# Altium footprint library JL_PCB.PCBLIB: 1112 footprints (part 47 of 71)
Each footprint in its own frame and in the unit in brackets; x right, y up, seen from the top. Pads: shape width x height; smd on the part's side, far side on the other; paste and mask are expansions set on the pad; w line width, h text height; cw(c..) or ccw(c..) is an arc to the next point about the centre after c.
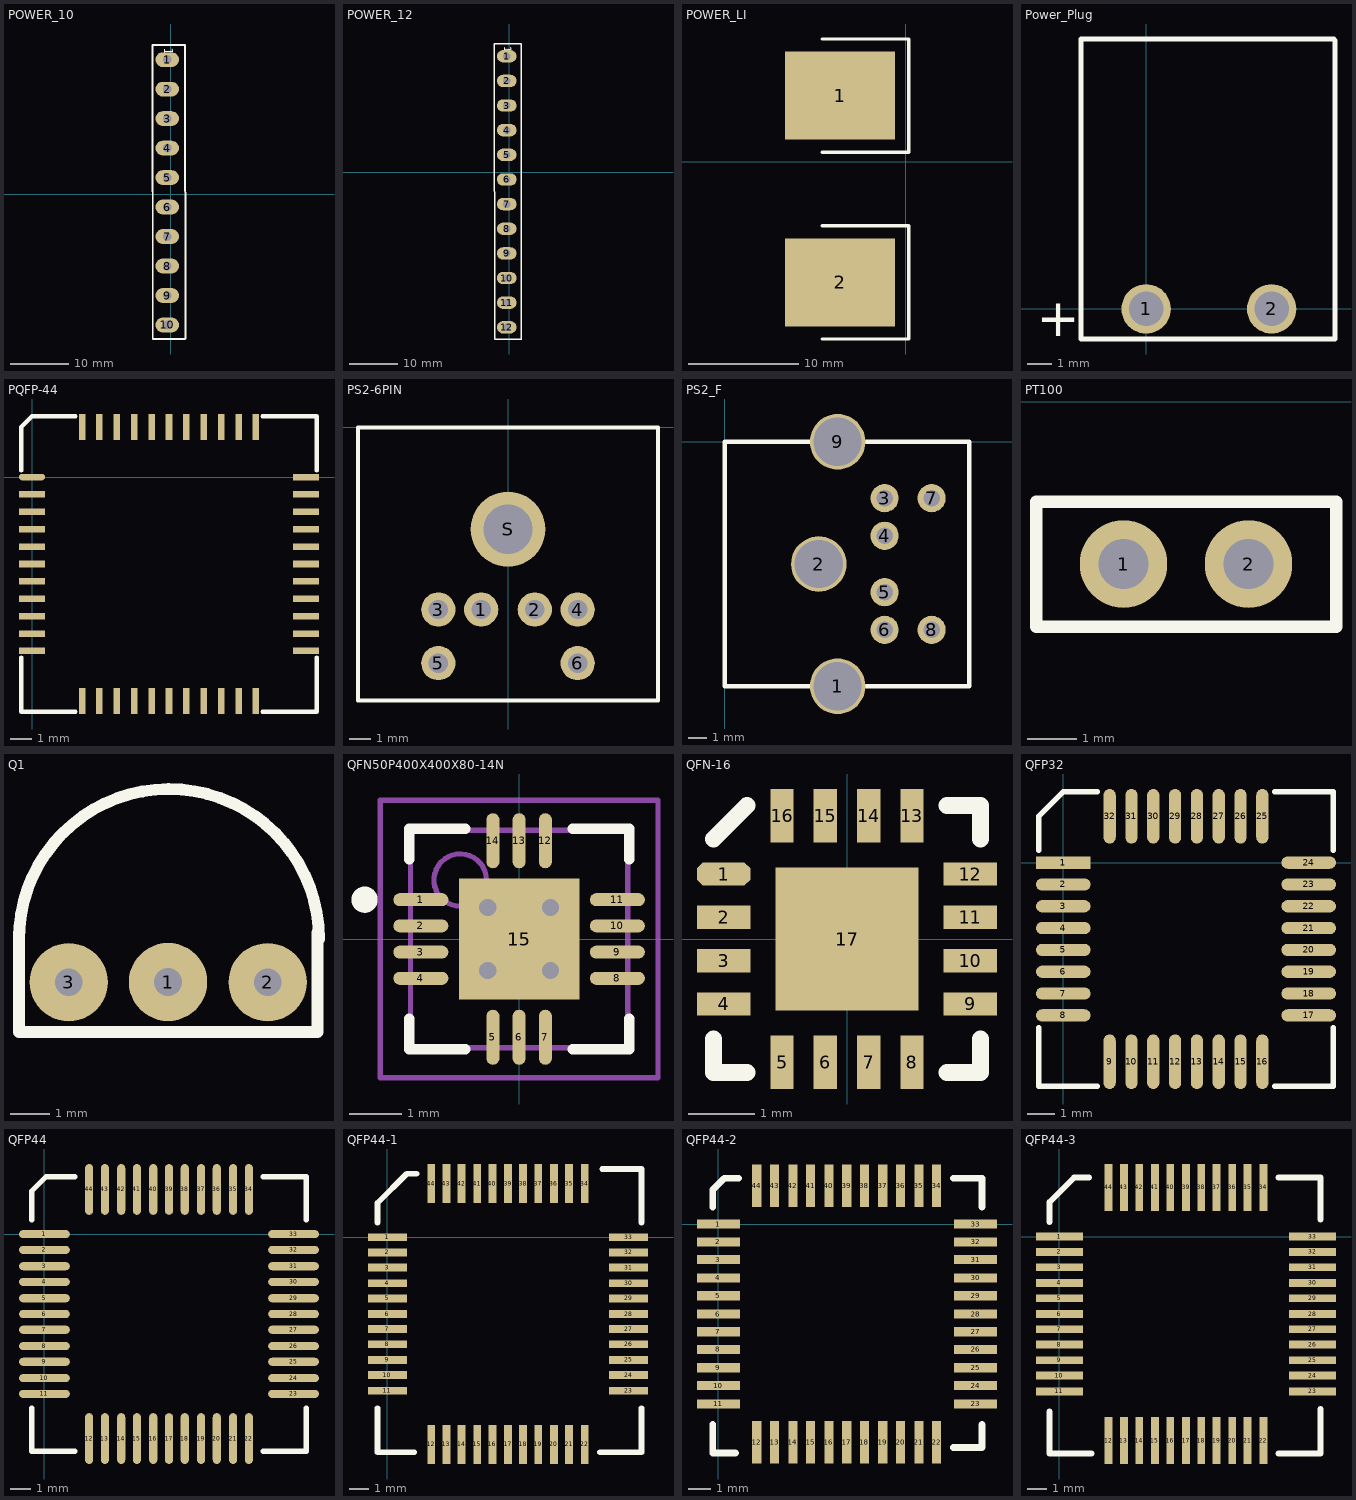
[diagram p46: the footprints below, top view; thin cyan lines are the x and y axes]

## POWER_10 [mil]
pads (10):
  oval 160x100 hole 60: 1(-24,913) 2(-24,713) 3(-24,513) 4(-24,313) 5(-24,113) 6(-24,-87) 7(-24,-287) 8(-24,-487) 9(-24,-687) 10(-24,-887)
TopOverlay:
  lines w12: 97,-982 -123,-982 -124,1013 96,1013 100,-980
  text "1" at -44,993 h60

## POWER_12 [mil]
pads (12):
  oval 160x100 hole 60: 1(-22,940) 2(-22,740) 3(-22,540) 4(-22,340) 5(-22,140) 6(-22,-60) 7(-22,-260) 8(-22,-460) 9(-22,-660) 10(-22,-860) 11(-22,-1060) 12(-22,-1260)
TopOverlay:
  lines w12: 98,-1355 98,1040 -122,1040 -121,-1355 99,-1355
  text "1" at -42,1020 h60

## POWER_LI [mm]
pads (2):
  rect 10x8 smd: 1(-6,6) 2(-6,-11)
TopOverlay:
  lines w0.305: -7.635,-16.159 0.27,-16.159 0.27,-5.841 -7.635,-5.841 ; -7.635,0.841 0.27,0.841 0.27,11.159 -7.635,11.159

## Power_Plug [mm]
pads (2):
  round 2 hole 1.4: 1(0,0) 2(5.08,0)
TopOverlay:
  lines w0.2: -2.642,10.871 -2.642,-1.219 7.595,-1.219 ; -2.642,10.922 7.595,10.922 ; 7.645,-1.219 7.645,10.871
  text "+" at -4.42,-1.118 h1.52

## PQFP-44 [mm]
pads (44):
  oval 1.2x0.3 smd: 1(0,0)
  rect 1.2x0.3 smd: 2(0,-0.8) 3(0,-1.6) 4(0,-2.4) 5(0,-3.2) 6(0,-4) 7(0,-4.8) 8(0,-5.6) 9(0,-6.4) 10(0,-7.2) 11(0,-8) 23(12.6,-8) 24(12.6,-7.2) 25(12.6,-6.4) 26(12.6,-5.6) 27(12.6,-4.8) 28(12.6,-4) 29(12.6,-3.2) 30(12.6,-2.4) 31(12.6,-1.6) 32(12.6,-0.8) 33(12.6,0)
  rect 0.3x1.2 smd: 12(2.3,-10.3) 13(3.1,-10.3) 14(3.9,-10.3) 15(4.7,-10.3) 16(5.5,-10.3) 17(6.3,-10.3) 18(7.1,-10.3) 19(7.9,-10.3) 20(8.7,-10.3) 21(9.5,-10.3) 22(10.3,-10.3) 34(10.3,2.3) 35(9.5,2.3) 36(8.7,2.3) 37(7.9,2.3) 38(7.1,2.3) 39(6.3,2.3) 40(5.5,2.3) 41(4.7,2.3) 42(3.9,2.3) 43(3.1,2.3) 44(2.3,2.3)
TopOverlay:
  lines w0.2: -0.5,-8.3 -0.5,-10.8 2,-10.8 ; -0.5,0.3 -0.5,2.3 0,2.8 2,2.8 ; 10.6,-10.8 13.1,-10.8 13.1,-8.3 ; 10.6,2.8 13.1,2.8 13.1,0.3

## PS2-6PIN [mm] "PS2 Socket, 6 Pin, Through Hole"
pads (7):
  round 1.6 hole 0.9: 1(-1.25,-8.5) 2(1.25,-8.5) 3(-3.25,-8.5) 4(3.25,-8.5) 5(-3.25,-11) 6(3.25,-11)
  round 3.5 hole 2.3: S(0,-4.75)
TopOverlay:
  lines w0.2: -7,-12.75 -7,0 7,0 7,-12.75 -7,-12.75

## PS2_F [mil]
pads (9):
  round 118.11 hole 102.36: 1(240,-520) 2(200,-260) 9(240,0)
  round 60 hole 35: 3(340,-120) 4(340,-200) 5(340,-320) 6(340,-400) 7(440,-120) 8(440,-400)
TopOverlay:
  lines w10: 0,-140 0,-120 ; 0,-520 520,-520 520,0 0,0 0,-520

## PT100 [mil]
pads (2):
  round 70 hole 40: 1(570,-130) 2(670,-130)
TopOverlay:
  lines w10: 500,-180 500,-80 740,-80 740,-180 500,-180

## Q1 [mm]
pads (3):
  round 2 hole 0.711: 1(34.736,-62.88) 2(37.28,-62.886) 3(32.2,-62.886)
TopOverlay:
  lines w0.3: 30.93,-61.81 cw(c34.76,-61.781) 38.59,-61.781
  lines w0.305: 30.93,-61.616 30.93,-64.156 38.55,-64.156 38.55,-61.616

## QFN50P400X400X80-14N [mm] "QFN, 14-Leads, Body 4.2x4.2mm (max), Pitch 0.50mm, IPC Medium Density"
height 3.55
pads (15):
  oval 1.05x0.25 smd: 1(-1.875,0.75) 2(-1.875,0.25) 3(-1.875,-0.25) 4(-1.875,-0.75) 8(1.875,-0.75) 9(1.875,-0.25) 10(1.875,0.25) 11(1.875,0.75)
  oval 0.25x1.05 smd: 5(-0.5,-1.875) 6(0,-1.875) 7(0.5,-1.875) 12(0.5,1.875) 13(0,1.875) 14(-0.5,1.875)
  rect 2.3x2.3 smd: 15(0,0)
via 0.6,-0.6 diameter 0.66 hole 0.33
via -0.6,-0.6 diameter 0.66 hole 0.33
via 0.6,0.6 diameter 0.66 hole 0.33
via -0.6,0.6 diameter 0.66 hole 0.33
TopOverlay:
  circle w0.25: c-2.95,0.75 r0.125
  lines w0.2: -2.1,-1.525 -2.1,-2.1 -1.025,-2.1 ; -2.1,1.525 -2.1,2.1 -1.025,2.1 ; 1.025,-2.1 2.1,-2.1 2.1,-1.525 ; 1.025,2.1 2.1,2.1 2.1,1.525
Mechanical13:
  circle w0.1: c-1.125,1.125 r0.5
  lines w0.1: -2.075,-2.075 2.075,-2.075 2.075,2.075 -2.075,2.075 -2.075,-2.075
Mechanical15:
  lines w0.1: -0.5,0 0.5,0 ; 0,-0.5 0,0.5 ; -2.65,-2.65 2.65,-2.65 2.65,2.65 -2.65,2.65 -2.65,-2.65
3D body: height 0.8, standoff 0.01, extent -2.075,-2.075 2.075,2.075

## QFN-16 [mm]
height 0.75
pads (17):
  oct 0.8x0.35 smd: 1(-1.85,0.975)
  rect 0.8x0.35 smd: 2(-1.85,0.325) 3(-1.85,-0.325) 4(-1.85,-0.975) 9(1.85,-0.975) 10(1.85,-0.325) 11(1.85,0.325) 12(1.85,0.975)
  rect 0.35x0.8 smd: 5(-0.975,-1.85) 6(-0.325,-1.85) 7(0.325,-1.85) 8(0.975,-1.85) 13(0.975,1.85) 14(0.325,1.85) 15(-0.325,1.85) 16(-0.975,1.85)
  rect 2.15x2.15 smd: 17(0,0)
TopOverlay:
  lines w0.254: -2,-1.5 -2,-2 -1.5,-2 ; -2,1.5 -1.5,2 ; 1.5,-2 2,-2 2,-1.5 ; 1.5,2 2,2 2,1.5
3D body "QFN-16.STEP": height 0.75, standoff 0, extent -1.975,-2.007 2.025,1.993

## QFP32 [mm]
pads (32):
  rect 2x0.45 smd: 1(0,0)
  oval 2x0.45 smd: 2(0,-0.8) 3(0,-1.6) 4(0,-2.4) 5(0,-3.2) 6(0,-4) 7(0,-4.8) 8(0,-5.6) 17(9,-5.6) 18(9,-4.8) 19(9,-4) 20(9,-3.2) 21(9,-2.4) 22(9,-1.6) 23(9,-0.8) 24(9,0)
  oval 0.45x2 smd: 9(1.7,-7.3) 10(2.5,-7.3) 11(3.3,-7.3) 12(4.1,-7.3) 13(4.9,-7.3) 14(5.7,-7.3) 15(6.5,-7.3) 16(7.3,-7.3) 25(7.3,1.7) 26(6.5,1.7) 27(5.7,1.7) 28(4.9,1.7) 29(4.1,1.7) 30(3.3,1.7) 31(2.5,1.7) 32(1.7,1.7)
TopOverlay:
  lines w0.2: -0.9,-6.05 -0.9,-8.2 1.25,-8.2 ; -0.9,0.45 -0.9,1.7 0,2.6 1.25,2.6 ; 7.75,-8.2 9.9,-8.2 9.9,-6.05 ; 7.75,2.6 9.9,2.6 9.9,0.45

## QFP44 [mil]
pads (44):
  oval 100x16 smd: 1(0,0) 2(0,-31) 3(0,-63) 4(0,-94) 5(0,-126) 6(0,-157) 7(0,-188) 8(0,-220) 9(0,-251) 10(0,-283) 11(0,-314) 23(490,-314) 24(490,-283) 25(490,-251) 26(490,-220) 27(490,-188) 28(490,-157) 29(490,-126) 30(490,-94) 31(490,-63) 32(490,-31) 33(490,0)
  oval 16x100 smd: 12(88,-402) 13(119,-402) 14(151,-402) 15(182,-402) 16(214,-402) 17(245,-402) 18(276,-402) 19(308,-402) 20(339,-402) 21(371,-402) 22(402,-402) 34(402,88) 35(371,88) 36(339,88) 37(308,88) 38(276,88) 39(245,88) 40(214,88) 41(182,88) 42(151,88) 43(119,88) 44(88,88)
TopOverlay:
  lines w10: -25,-342 -25,-427 60,-427 ; -25,28 -25,85 3,113 60,113 ; 430,-427 515,-427 515,-342 ; 430,113 515,113 515,28

## QFP44-1 [mil]
pads (44):
  rect 80x16 smd: 1(0,0) 2(0,-31) 3(0,-62) 4(0,-94) 5(0,-125) 6(0,-157) 7(0,-188) 8(0,-219) 9(0,-251) 10(0,-282) 11(0,-314) 23(494,-314) 24(494,-282) 25(494,-251) 26(494,-219) 27(494,-188) 28(494,-157) 29(494,-125) 30(494,-94) 31(494,-62) 32(494,-31) 33(494,0)
  rect 16x80 smd: 12(90,-424) 13(121,-424) 14(152,-424) 15(184,-424) 16(215,-424) 17(247,-424) 18(278,-424) 19(309,-424) 20(341,-424) 21(372,-424) 22(404,-424) 34(404,110) 35(372,110) 36(341,110) 37(309,110) 38(278,110) 39(247,110) 40(215,110) 41(184,110) 42(152,110) 43(121,110) 44(90,110)
TopOverlay:
  lines w12: -20,-350 -20,-440 55,-440 ; -20,30 -20,70 40,130 60,130 ; 435,-440 520,-440 520,-350 ; 440,140 520,140 520,30

## QFP44-2 [mil]
pads (44):
  rect 75x16 smd: 1(0,0) 2(0,-31) 3(0,-62) 4(0,-94) 5(0,-125) 6(0,-157) 7(0,-188) 8(0,-219) 9(0,-251) 10(0,-282) 11(0,-314) 23(449,-314) 24(449,-282) 25(449,-251) 26(449,-219) 27(449,-188) 28(449,-157) 29(449,-125) 30(449,-94) 31(449,-62) 32(449,-31) 33(449,0)
  rect 16x75 smd: 12(67,-381) 13(98,-381) 14(130,-381) 15(161,-381) 16(193,-381) 17(224,-381) 18(255,-381) 19(287,-381) 20(318,-381) 21(350,-381) 22(381,-381) 34(381,67) 35(350,67) 36(318,67) 37(287,67) 38(255,67) 39(224,67) 40(193,67) 41(161,67) 42(130,67) 43(98,67) 44(67,67)
TopOverlay:
  lines w12: -10,-350 -10,-400 30,-400 ; -10,30 -10,60 10,80 35,80 ; 410,-390 460,-390 460,-350 ; 410,80 460,80 460,30

## QFP44-3 [mil]
pads (44):
  rect 95x16 smd: 1(0,0) 2(0,-31) 3(0,-62) 4(0,-94) 5(0,-125) 6(0,-157) 7(0,-188) 8(0,-219) 9(0,-251) 10(0,-282) 11(0,-314) 23(514,-314) 24(514,-282) 25(514,-251) 26(514,-219) 27(514,-188) 28(514,-157) 29(514,-125) 30(514,-94) 31(514,-62) 32(514,-31) 33(514,0)
  rect 16x95 smd: 12(100,-414) 13(131,-414) 14(162,-414) 15(194,-414) 16(225,-414) 17(257,-414) 18(288,-414) 19(319,-414) 20(351,-414) 21(382,-414) 22(414,-414) 34(414,100) 35(382,100) 36(351,100) 37(319,100) 38(288,100) 39(257,100) 40(225,100) 41(194,100) 42(162,100) 43(131,100) 44(100,100)
TopOverlay:
  lines w12: -20,-355 -20,-440 65,-440 ; -20,30 -20,70 30,120 60,120 ; 445,-440 530,-440 530,-350 ; 445,120 530,120 530,35